# Altium footprint library cool_library.PcbLib: 1182 footprints (part 70 of 75)
Each footprint in its own frame and in the unit in brackets; x right, y up, seen from the top. Pads: shape width x height; smd on the part's side, far side on the other; paste and mask are expansions set on the pad; w line width, h text height; cw(c..) or ccw(c..) is an arc to the next point about the centre after c.
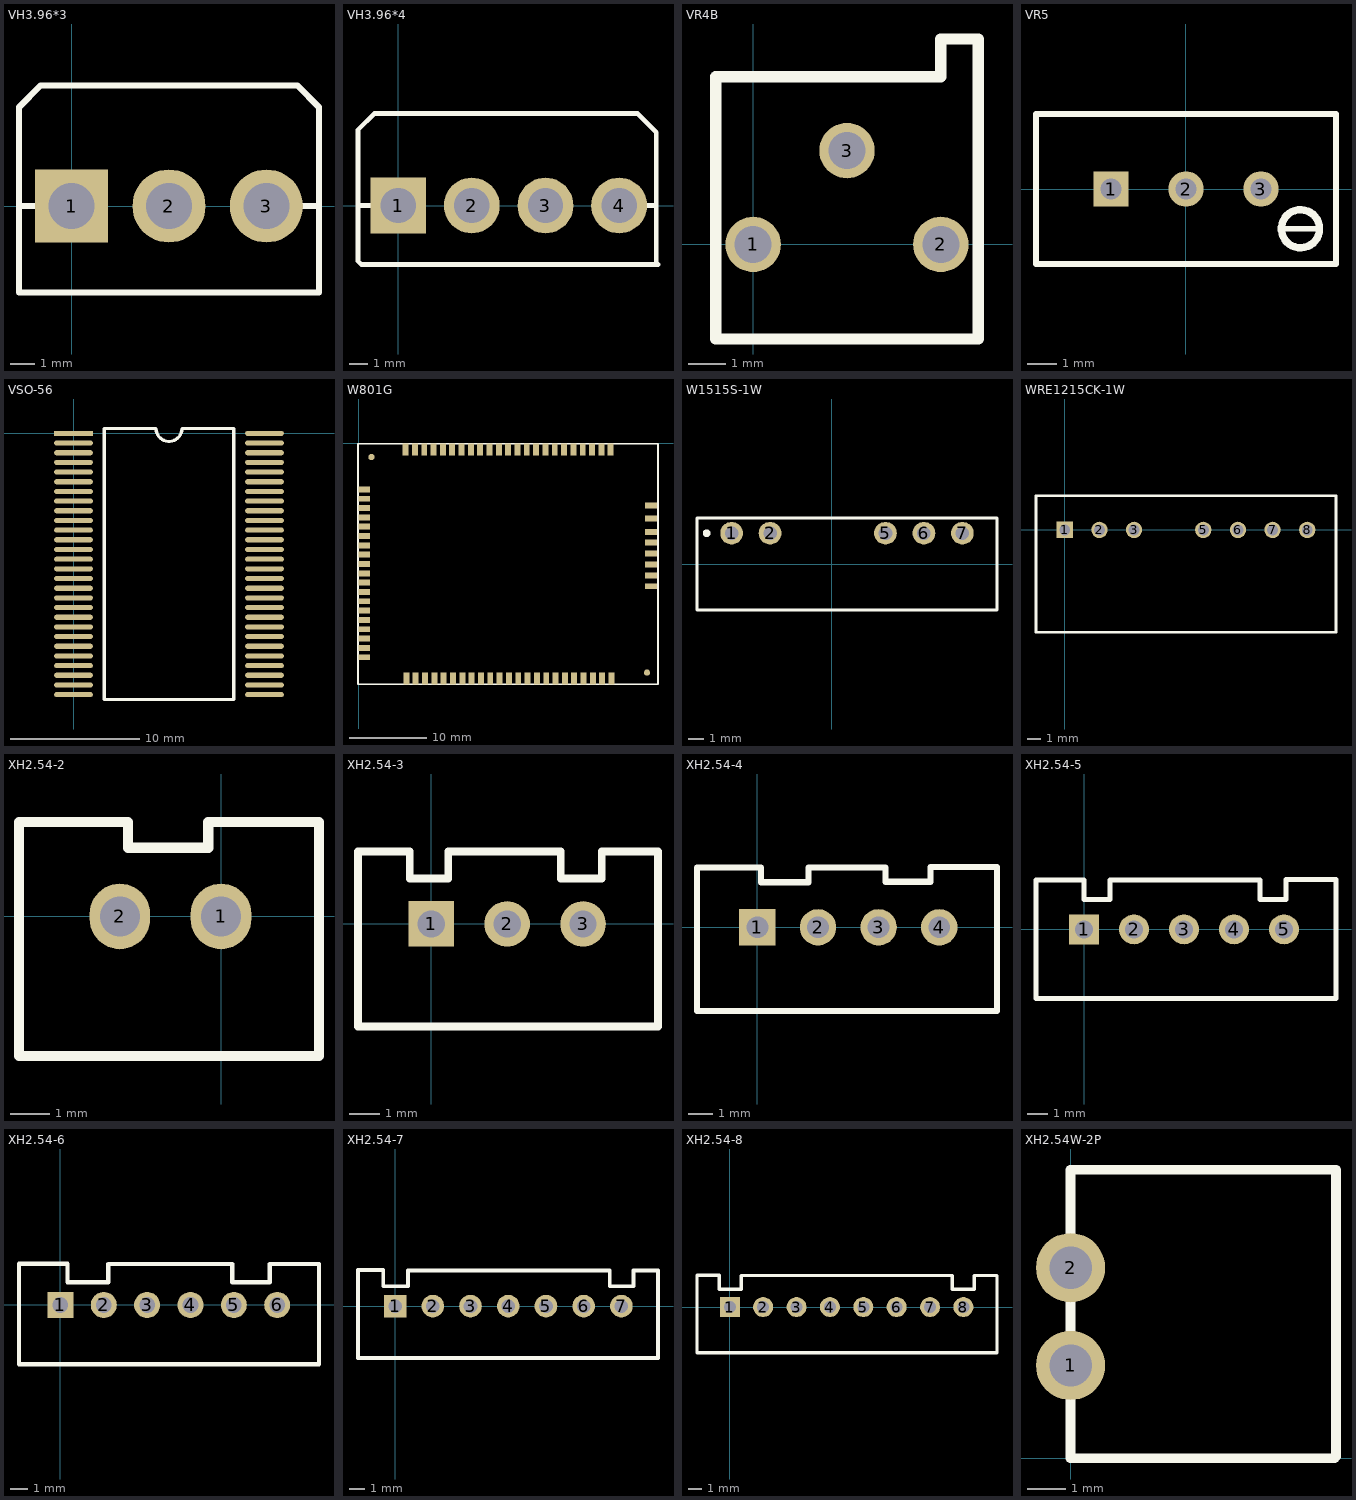
[diagram p69: the footprints below, top view; thin cyan lines are the x and y axes]

## VH3.96*3 [mm]
pads (3):
  rect 3x3 hole 1.9: 1(0,0)
  round 3 hole 1.9: 2(4,0) 3(8,0)
Top Overlay:
  lines w0.254: 0,0 -2.159,0 ; 8.001,0 10.16,0 ; -2.159,0 -2.159,4.064 -1.27,4.953 9.271,4.953 10.16,4.064 10.16,0 ; -2.159,0 -2.159,-3.556 10.16,-3.556 10.16,0

## VH3.96*4 [mm]
pads (4):
  rect 3x3 hole 1.9: 1(0,0)
  round 3 hole 1.9: 2(3.96,0) 3(7.92,0) 4(11.88,0)
Top Overlay:
  lines w0.254: -2,0 0,0 ; -1.016,4.953 12.319,4.953 12.864,4.953 13.88,3.937 13.88,-0.762 ; -0.762,4.953 -1.27,4.953 -2.159,4.064 -2.159,3.969 -2.159,0 -2.159,-2.984 -2,-3.143 -1.968,-3.175 13.97,-3.175 13.88,-3.085 13.88,0 11.88,0

## VR4B [mm]
pads (3):
  round 1.5 hole 1: 1(0,0) 2(5.08,0) 3(2.54,2.54)
Top Overlay:
  lines w0.305: -1.01,-2.56 6.09,-2.56 6.09,5.562 5.08,5.562 5.08,4.54 -1.01,4.54 -1.01,-2.56

## VR5 [mm] "Thru-Hole; 3 Leads"
pads (3):
  rect 1.2x1.2 hole 0.7: 1(-2.54,0)
  round 1.2 hole 0.7: 2(0,0) 3(2.54,0)
Top Overlay:
  circle w0.254: c3.876,-1.346 r0.645
  lines w0.2: 3.2,-1.346 4.49,-1.346 ; -5.08,-2.54 5.08,-2.54 5.08,0 5.08,2.54 -5.08,2.54 -5.08,-2.54
3D body: height 10, standoff 0, extent -5.055,-2.565 5.08,2.54
3D body: height 10.5, standoff 0, extent 3.099,-2.108 4.648,-0.584

## VSO-56 [mm]
pads (56):
  rect 3x0.4 smd: 1(0,0)
  oval 3x0.4 smd: 2(0,-0.75) 3(0,-1.5) 4(0,-2.25) 5(0,-3) 6(0,-3.75) 7(0,-4.5) 8(0,-5.25) 9(0,-6) 10(0,-6.75) 11(0,-7.5) 12(0,-8.25) 13(0,-9) 14(0,-9.75) 15(0,-10.5) 16(0,-11.25) 17(0,-12) 18(0,-12.75) 19(0,-13.5) 20(0,-14.25) 21(0,-15) 22(0,-15.75) 23(0,-16.5) 24(0,-17.25) 25(0,-18) 26(0,-18.75) 27(0,-19.5) 28(0,-20.25) 29(14.8,-20.25) 30(14.8,-19.5) 31(14.8,-18.75) 32(14.8,-18) 33(14.8,-17.25) 34(14.8,-16.5) 35(14.8,-15.75) 36(14.8,-15) 37(14.8,-14.25) 38(14.8,-13.5) 39(14.8,-12.75) 40(14.8,-12) 41(14.8,-11.25) 42(14.8,-10.5) 43(14.8,-9.75) 44(14.8,-9) 45(14.8,-8.25) 46(14.8,-7.5) 47(14.8,-6.75) 48(14.8,-6) 49(14.8,-5.25) 50(14.8,-4.5) 51(14.8,-3.75) 52(14.8,-3) 53(14.8,-2.25) 54(14.8,-1.5) 55(14.8,-0.75) 56(14.8,0)
Top Overlay:
  lines w0.25: 2.385,-20.625 2.385,0.375 6.4,0.375 ccw(c7.4,0.375) 8.4,0.375 12.415,0.375 12.415,-20.625 2.385,-20.625

## W801G [mil]
pads (75):
  rect 30x60 smd: 1(1276.58,-31) 2(1229.34,-31) 3(1182.1,-31) 4(1134.85,-31) 5(1087.61,-31) 6(1040.36,-31) 7(993.12,-31) 8(945.88,-31) 9(898.63,-31) 10(851.39,-31) 11(804.14,-31) 12(756.9,-31) 13(709.66,-31) 14(662.41,-31) 15(615.17,-31) 16(567.92,-31) 17(520.68,-31) 18(473.43,-31) 19(426.19,-31) 20(378.95,-31) 21(331.7,-31) 22(284.46,-31) 23(237.21,-31) 43(241.21,-1191) 44(288.46,-1191) 45(335.7,-1191) 46(382.95,-1191) 47(430.19,-1191) 48(477.43,-1191) 49(524.68,-1191) 50(571.92,-1191) 51(619.17,-1191) 52(666.41,-1191) 53(713.66,-1191) 54(760.9,-1191) 55(808.14,-1191) 56(855.39,-1191) 57(902.63,-1191) 58(949.88,-1191) 59(997.12,-1191) 60(1044.36,-1191) 61(1091.61,-1191) 62(1138.85,-1191) 63(1186.1,-1191) 64(1233.34,-1191) 65(1280.58,-1191)
  rect 60x30 smd: 24(28.21,-233) 25(28.21,-280.24) 26(28.21,-327.49) 27(28.21,-374.73) 28(28.21,-421.98) 29(28.21,-469.22) 30(28.21,-516.46) 31(28.21,-563.71) 32(28.21,-610.95) 33(28.21,-658.2) 34(28.21,-705.44) 35(28.21,-752.68) 36(28.21,-799.93) 37(28.21,-847.17) 38(28.21,-894.42) 39(28.21,-941.66) 40(28.21,-988.9) 41(28.21,-1036.15) 42(28.21,-1083.39) 66(1481.21,-723.59) 67(1481.21,-668.47) 68(1481.21,-613.35) 69(1481.21,-558.24) 70(1481.21,-503.12) 71(1481.21,-448) 72(1481.21,-381.07) 73(1481.21,-314.14)
  round 31.5 smd: ""(64.44,-69.26) ""(1460.44,-1161.26)
Top Overlay:
  lines w8: -3.79,-1221 -3.79,-1 1516.21,-1 1516.21,-1221 -3.79,-1221

## W1515S-1W [mm] "金升阳DC-DC模块"
pads (5):
  round 1.5 hole 0.9: 1(-6.604,2.032) 2(-4.064,2.032) 5(3.556,2.032) 6(6.096,2.032) 7(8.636,2.032)
Top Overlay:
  circle w0.254: c-8.255,2.032 r0.127
  lines w0.2: -8.89,-3.048 10.922,-3.048 10.922,3.048 -8.89,3.048 -8.89,-3.048

## WRE1215CK-1W [mm] "DC-DC"
pads (7):
  rect 1.2x1.2 hole 0.8: 1(0,0)
  round 1.2 hole 0.8: 2(2.54,0) 3(5.08,0) 5(10.16,0) 6(12.7,0) 7(15.24,0) 8(17.78,0)
Top Overlay:
  lines w0.2: -2.11,-7.5 19.89,-7.5 19.89,2.5 -2.11,2.5 -2.11,-7.5

## XH2.54-2 [mil]
pads (2):
  oval 60x65 hole 39.37: 1(0,0) 2(-100.1,0)
Top Overlay:
  lines w10: -200,-138 -200,93.3 -92.1,93.3 -92.1,68 -12.6,68 -12.6,93.3 66.2,93.3 97,93.3 97,-138 -200,-138
3D body: height 275.59, standoff -118.11, extent -197.64,-142.11 97.64,94.11

## XH2.54-3 [mm]
pads (3):
  rect 1.5x1.5 hole 0.9: 1(0,0)
  round 1.5 hole 0.9: 2(2.5,0) 3(5,0)
Top Overlay:
  lines w0.254: -2.413,-3.378 -2.413,2.388 -0.711,2.388 -0.711,1.5 0.559,1.5 0.559,2.388 4.267,2.388 4.267,1.5 5.613,1.5 5.613,2.388 7.468,2.388 7.468,-3.378 -2.413,-3.378
3D body: height 7, standoff -3.4, extent -2.41,-3.408 7.49,2.342

## XH2.54-4 [mm]
pads (4):
  rect 1.5x1.5 hole 0.9: 1(0,0)
  round 1.5 hole 0.9: 2(2.5,0) 3(5,0) 4(7.5,0)
Top Overlay:
  lines w0.254: -2.489,-3.454 -2.489,2.464 0.152,2.464 0.152,1.854 2.108,1.854 2.108,2.464 5.283,2.464 5.283,1.88 7.137,1.88 7.137,2.489 9.881,2.489 9.881,-3.454 -2.489,-3.454
3D body: height 7, standoff -3.4, extent -2.466,-3.383 9.934,2.367

## XH2.54-5 [mm]
pads (5):
  rect 1.5x1.5 hole 0.9: 1(0,0)
  round 1.5 hole 0.9: 2(2.5,0) 3(5,0) 4(7.5,0) 5(10,0)
Top Overlay:
  lines w0.254: 1.3,2.438 1.3,1.5 0,1.5 0,2.464 -2.4,2.464 -2.4,-3.454 12.6,-3.454 12.6,2.489 10.1,2.489 10.1,1.5 8.8,1.5 8.8,2.464 1.3,2.464
3D body: height 7, standoff -3.4, extent -2.511,-3.388 12.519,2.362

## XH2.54-6 [mm]
pads (6):
  rect 1.5x1.5 hole 0.9: 1(0,0)
  round 1.5 hole 0.9: 2(2.5,0) 3(5,0) 4(7.5,0) 5(10,0) 6(12.5,0)
Top Overlay:
  lines w0.254: -2.388,-3.429 -2.388,2.388 0.406,2.388 0.406,1.321 2.769,1.321 2.769,2.362 9.906,2.362 9.906,1.321 12.065,1.321 12.065,2.362 14.91,2.362 14.91,-3.429 -2.388,-3.429
3D body: height 7, standoff -3.4, extent -2.477,-3.383 14.923,2.367

## XH2.54-7 [mm]
pads (7):
  rect 1.5x1.5 hole 0.9: 1(0,0)
  round 1.5 hole 0.9: 2(2.5,0) 3(5,0) 4(7.5,0) 5(10,0) 6(12.5,0) 7(15,0)
Top Overlay:
  lines w0.254: -2.457,-3.429 17.424,-3.429 17.424,2.362 15.799,2.362 15.799,1.321 14.224,1.321 14.224,2.362 0.864,2.362 0.864,1.321 -0.787,1.321 -0.787,2.388 -2.457,2.388 -2.457,-3.429
3D body: height 7, standoff -3.4, extent -2.457,-3.388 17.443,2.362

## XH2.54-8 [mm]
pads (8):
  rect 1.5x1.5 hole 0.9: 1(0,0)
  round 1.5 hole 0.9: 2(2.5,0) 3(5,0) 4(7.5,0) 5(10,0) 6(12.5,0) 7(15,0) 8(17.5,0)
Top Overlay:
  lines w0.254: -2.457,-3.429 -2.457,2.388 -0.787,2.388 -0.787,1.321 0.864,1.321 0.864,2.362 16.662,2.362 16.662,1.321 18.313,1.321 18.313,2.362 20.015,2.362 20.015,-3.429 -2.457,-3.429
3D body: height 7, standoff -3.4, extent -2.462,-3.375 19.938,2.375

## XH2.54W-2P [mm]
pads (2):
  round 1.8 hole 1.1: 1(0,2.413) 2(0,4.953)
Top Overlay:
  lines w0.254: 0,0 0,7.5 6.9,7.5 6.9,0.042 6.858,0 0,0